# Altium footprint library 常用元件封装库.PcbLib: 1310 footprints (part 29 of 83)
Each footprint in its own frame and in the unit in brackets; x right, y up, seen from the top. Pads: shape width x height; smd on the part's side, far side on the other; paste and mask are expansions set on the pad; w line width, h text height; cw(c..) or ccw(c..) is an arc to the next point about the centre after c.
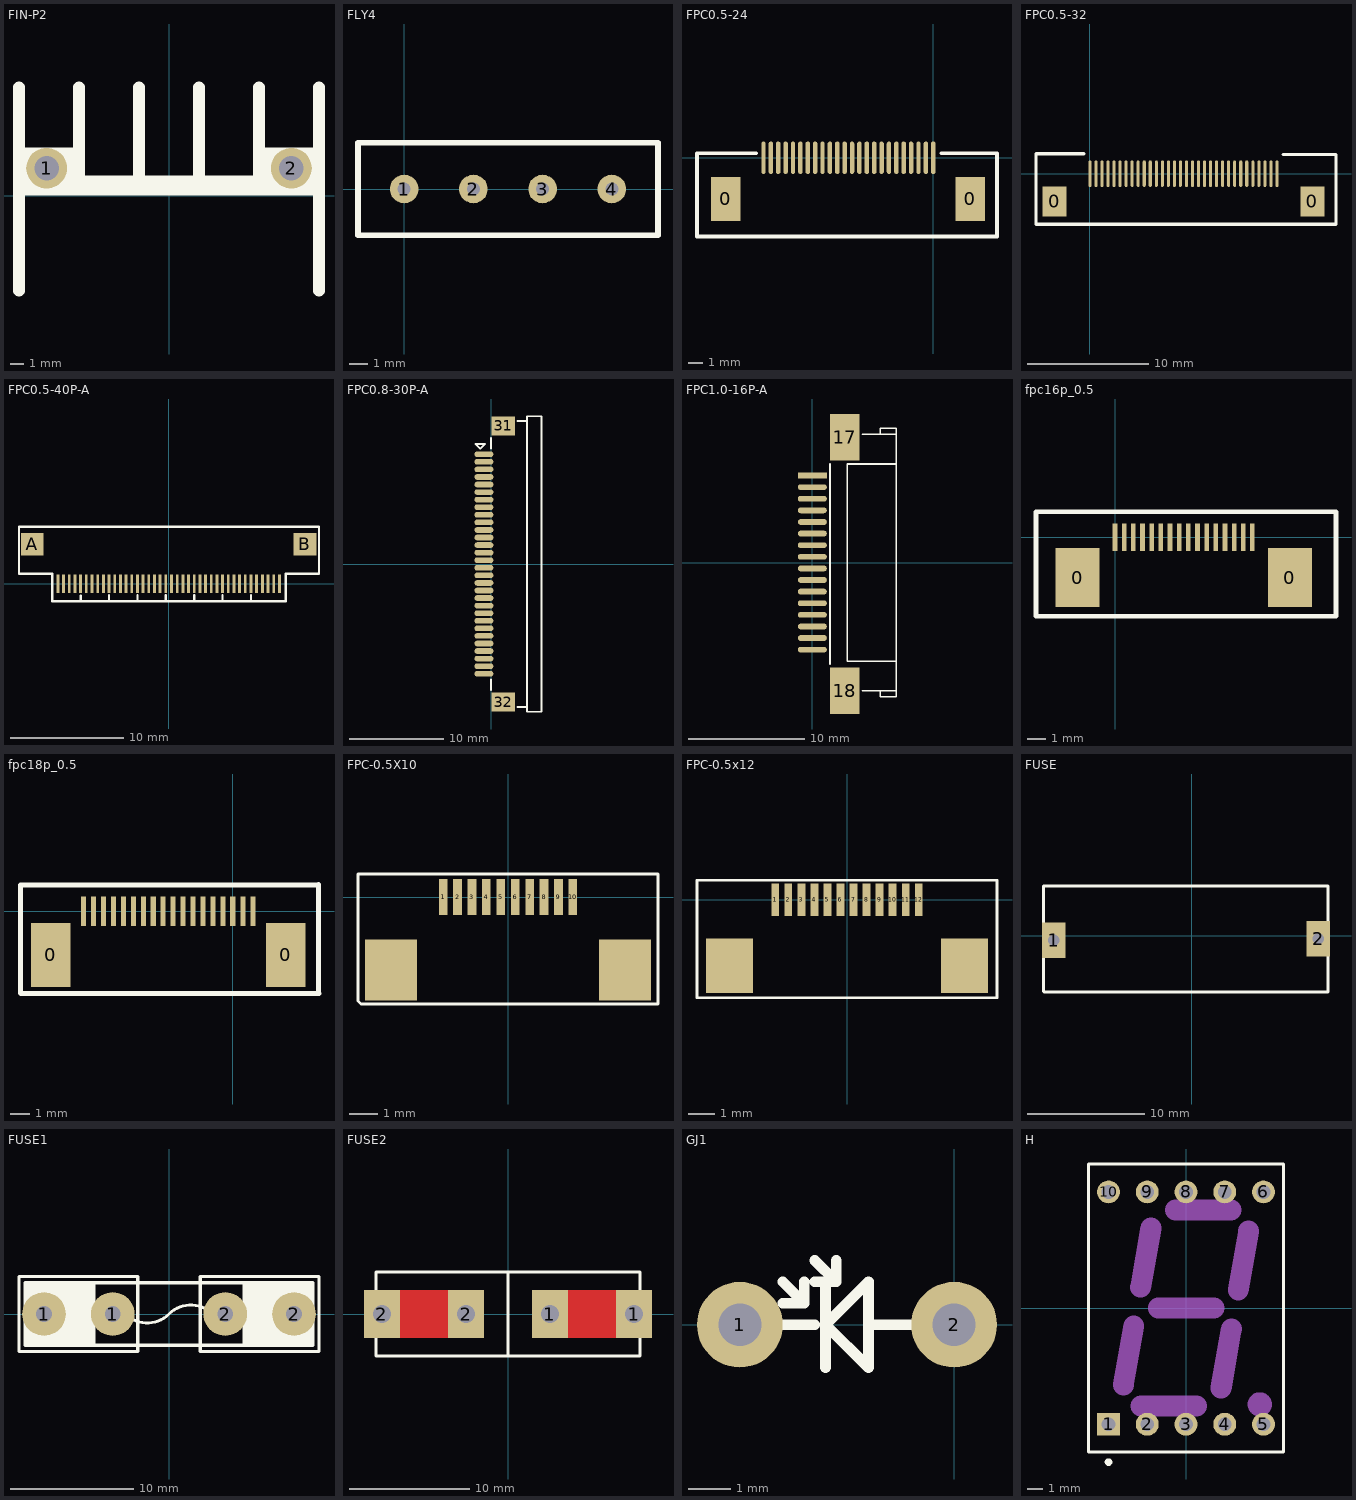
[diagram p28: the footprints below, top view; thin cyan lines are the x and y axes]

## FIN-P2 [mm] "散热片"
height 1.9
pads (2):
  round 3 hole 1.8: 1(-9.017,2.032) 2(9.017,2.032)
Top Overlay:
  rectangle: -11.049,0.889 -6.629,3.556
  rectangle: 6.629,1.27 11.049,3.556
  lines w0.85: -11.049,-7 -11.049,8 ; -6.629,0.762 -6.629,8.001 ; -2.21,0.762 -2.21,8.001 ; 2.21,0.762 2.21,8.001 ; 6.629,0.762 6.629,8.001 ; 11.049,-7 11.049,8
  lines w1.5: -10.668,0.762 10.668,0.762

## FLY4 [mil]
pads (4):
  round 62 hole 28: 1(0,0) 2(150,0) 3(300,0) 4(450,0)
Top Overlay:
  lines w12: -100,-100 550,-100 550,100 -100,100 -100,-100

## FPC0.5-24 [mm]
height 19.2
pads (26):
  rect 2x3 smd: 0(-14.04,-2.794) 0(2.51,-2.794)
  oval 0.3x2.2 smd: 1(0,0) 2(-0.5,0) 3(-1,0) 4(-1.5,0) 5(-2,0) 6(-2.5,0) 7(-3,0) 8(-3.5,0) 9(-4,0) 10(-4.5,0) 11(-5,0) 12(-5.5,0) 13(-6,0) 14(-6.5,0) 15(-7,0) 16(-7.5,0) 17(-8,0) 18(-8.5,0) 19(-9,0) 20(-9.5,0) 21(-10,0) 22(-10.5,0) 23(-11,0) 24(-11.5,0)
Top Overlay:
  lines w0.254: -12,0.305 -16.002,0.305 -16.002,-5.334 4.318,-5.334 4.318,0.305 0.563,0.305
3D body "2-1734839-4.stp": height 2.07, standoff 0.02, extent -14.5,-5.364 2.93,-0.254

## FPC0.5-32 [mm]
pads (34):
  rect 2x2.5 smd: 0(-2.935,-2.295) 0(18.435,-2.295)
  oval 0.254x2.2 smd: 1(0,0) 2(0.5,0) 3(1,0) 4(1.5,0) 5(2,0) 6(2.5,0) 7(3,0) 8(3.5,0) 9(4,0) 10(4.5,0) 11(5,0) 12(5.5,0) 13(6,0) 14(6.5,0) 15(7,0) 16(7.493,0) 17(8,0) 18(8.5,0) 19(9,0) 20(9.5,0) 21(10,0) 22(10.5,0) 23(11,0) 24(11.5,0) 25(12,0) 26(12.5,0) 27(13,0) 28(13.5,0) 29(14,0) 30(14.5,0) 31(15,0) 32(15.5,0)
Top Overlay:
  lines w0.254: -0.5,1.651 -4.47,1.651 -4.47,-4.195 20.396,-4.195 20.396,1.575 16,1.575
3D body "3-1734820-2.stp": height 2.04, standoff 0.14, extent -3.404,-6.173 18.846,0.027

## FPC0.5-40P-A [mm]
height 1
pads (42):
  rect 0.25x1.6 smd: 1(-9.78,0.011) 2(-9.28,0.011) 3(-8.78,0.011) 4(-8.28,0.011) 5(-7.78,0.011) 6(-7.28,0.011) 7(-6.78,0.011) 8(-6.28,0.011) 9(-5.78,0.011) 10(-5.28,0.011) 11(-4.78,0.011) 12(-4.28,0.011) 13(-3.78,0.011) 14(-3.28,0.011) 15(-2.78,0.011) 16(-2.28,0.011) 17(-1.78,0.011) 18(-1.28,0.011) 19(-0.78,0.011) 20(-0.28,0.011) 21(0.22,0.011) 22(0.72,0.011) 23(1.22,0.011) 24(1.72,0.011) 25(2.22,0.011) 26(2.72,0.011) 27(3.22,0.011) 28(3.72,0.011) 29(4.22,0.011) 30(4.72,0.011) 31(5.22,0.011) 32(5.72,0.011) 33(6.22,0.011) 34(6.72,0.011) 35(7.22,0.011) 36(7.72,0.011) 37(8.22,0.011) 38(8.72,0.011) 39(9.22,0.011) 40(9.72,0.011)
  rect 2x2 smd: A(-12.029,3.5) B(11.971,3.5)
Top Overlay:
  lines w0.2: -10.287,-1.524 -10.287,0.889 -13.208,0.889 -13.208,5.036 13.208,5.036 13.208,1.27 13.208,0.889 10.287,0.889 10.287,-1.514 -10.287,-1.514 ; -7.78,-1.514 -7.78,-1.014 ; -5.28,-1.514 -5.28,-0.989 ; -2.78,-1.489 -2.78,-0.989 ; -0.28,-1.464 -0.28,-0.964 ; 2.22,-1.464 2.22,-0.964 ; 4.72,-1.464 4.72,-0.964 ; 7.22,-1.464 7.22,-0.964

## FPC0.8-30P-A [mm] "FPC"
height 1.2
pads (32):
  oval 2x0.6 smd: 1(-0.762,11.6) 2(-0.762,10.8) 3(-0.762,10) 4(-0.762,9.2) 5(-0.762,8.4) 6(-0.762,7.6) 7(-0.762,6.8) 8(-0.762,6) 9(-0.762,5.2) 10(-0.762,4.4) 11(-0.762,3.6) 12(-0.762,2.8) 13(-0.762,2) 14(-0.762,1.2) 15(-0.762,0.4) 16(-0.762,-0.4) 17(-0.762,-1.2) 18(-0.762,-2) 19(-0.762,-2.8) 20(-0.762,-3.6) 21(-0.762,-4.4) 22(-0.762,-5.2) 23(-0.762,-6) 24(-0.762,-6.8) 25(-0.762,-7.6) 26(-0.762,-8.4) 27(-0.762,-9.2) 28(-0.762,-10) 29(-0.762,-10.8) 30(-0.762,-11.6)
  rect 2.5x2 smd: 31(1.27,14.605) 32(1.27,-14.605)
Top Overlay:
  lines w0.2: 0,-13.335 0,-12.192 ; 0,12.192 0,13.335 ; 2.794,-15.113 3.81,-15.113 ; 2.794,15.113 3.81,15.113 ; 3.81,-15.113 3.81,15.113 ; 3.81,-15.113 3.81,-15.621 5.334,-15.621 5.334,15.621 3.81,15.621 3.81,15.113 ; -1.651,12.7 -1.143,12.192 -0.635,12.7 -1.524,12.7 -1.651,12.7

## FPC1.0-16P-A [mm] "FPC"
height 1.2
pads (18):
  rect 2.5x0.5 smd: 1(0,7.493)
  oval 2.5x0.5 smd: 2(0,6.493) 3(0,5.493) 4(0,4.493) 5(0,3.493) 6(0,2.493) 7(0,1.493) 8(0,0.493) 9(0,-0.507) 10(0,-1.507) 11(0,-2.507) 12(0,-3.507) 13(0,-4.507) 14(0,-5.507) 15(0,-6.507) 16(0,-7.507)
  rect 2.5x4 smd: 17(2.794,10.795) 18(2.794,-11.049)
Top Overlay:
  lines w0.15: 1.524,-8.763 1.524,8.509 ; 4.318,-11.049 7.224,-11.049 ; 4.318,11.049 7.224,11.049 ; 5.842,11.049 5.842,11.557 7.224,11.557 7.224,11.049 ; 6.096,-11.049 5.842,-11.049 5.842,-11.557 7.224,-11.557 7.224,-11.049 ; 7.224,-8.507 3,-8.507 3,8.493 7.224,8.493 ; 7.224,-11.049 7.224,11.049

## fpc16p_0.5 [mm]
height 1.45
pads (18):
  rect 2.4x3.2 smd: 0(-2.05,-2.2) 0(9.55,-2.2)
  rect 0.254x1.5 smd: 1(0,0) 2(0.5,0) 3(1,0) 4(1.5,0) 5(2,0) 6(2.5,0) 7(3,0) 8(3.5,0) 9(4,0) 10(4.5,0) 11(5,0) 12(5.5,0) 13(6,0) 14(6.5,0) 15(7,0) 16(7.5,0)
Top Overlay:
  lines w0.254: -4.318,-4.318 12.065,-4.318 12.065,1.397 -4.318,1.397 -4.318,-4.318

## fpc18p_0.5 [mm]
height 1.45
pads (20):
  rect 2x3.2 smd: 0(-9.143,-2.2) 0(2.673,-2.2)
  rect 0.254x1.5 smd: 1(-7.493,0) 2(-6.993,0) 3(-6.493,0) 4(-5.993,0) 5(-5.493,0) 6(-4.993,0) 7(-4.493,0) 8(-3.993,0) 9(-3.493,0) 10(-2.993,0) 11(-2.493,0) 12(-1.993,0) 13(-1.493,0) 14(-0.993,0) 15(-0.493,0) 16(0.007,0) 17(0.523,0) 18(1.023,0)
Top Overlay:
  lines w0.254: -10.668,-4.115 -10.643,-4.14 4.343,-4.14 4.318,-4.115 4.318,1.346 4.293,1.321 -10.668,1.321 -10.668,-4.115
3D body "1-1734839-8.stp": height 2.07, standoff 0.02, extent -10.441,-5.014 3.989,0.096

## FPC-0.5X10 [mm]
pads (12):
  rect 0.3x1.25 smd: 1(-2.25,0) 2(-1.75,0) 3(-1.25,0) 4(-0.75,0) 5(-0.25,0) 6(0.25,0) 7(0.75,0) 8(1.25,0) 9(1.75,0) 10(2.25,0)
  rect 1.8x2.1 smd: ""(-4.05,-2.525) ""(4.05,-2.525)
Top Overlay:
  lines w0.102: -5.2,-3.6 -5.2,0.8 5.2,0.8 5.2,-3.7 -5.1,-3.7 -5.2,-3.6

## FPC-0.5x12 [mm]
pads (14):
  rect 0.3x1.25 smd: 1(-2.75,0) 2(-2.25,0) 3(-1.75,0) 4(-1.25,0) 5(-0.75,0) 6(-0.25,0) 7(0.25,0) 8(0.75,0) 9(1.25,0) 10(1.75,0) 11(2.25,0) 12(2.75,0)
  rect 1.8x2.1 smd: ""(-4.5,-2.525) ""(4.5,-2.525)
Top Overlay:
  lines w0.102: -5.75,-3.75 5.75,-3.75 5.75,0.75 -5.75,0.75 -5.75,-3.75

## FUSE [mm]
pads (2):
  rect 2x3 hole 1 square: 1(-11.76,-0.381) 2(10.744,-0.254)
Top Overlay:
  lines w0.254: -12.624,-4.724 -12.624,4.242 11.582,4.242 11.582,-4.775 -12.573,-4.775 -12.624,-4.724
3D body "User Library-5x20mm PCB Fuse Holder Assy_ 1.STEP": height 14.29, standoff -4.06, extent -12.62,-4.79 11.63,4.21

## FUSE1 [mil]
pads (4):
  round 140 hole 50: 1(-400,0) 1(-180,0) 2(180,0) 2(400,0)
Top Overlay:
  rectangle: -460,-100 -240,100
  rectangle: 240,-100 460,100
  lines w10: -240,-100 -240,100 ; -140,0 ccw(c-70,70) 0,0 cw(c70,-70) 140,0 ; 240,-100 240,100 ; -480,-120 -480,0 -480,120 -100,120 -100,-120 -480,-120 ; -460,-100 460,-100 460,100 440,100 -460,100 -460,-100 ; 100,-120 100,120 480,120 480,-120 100,-120

## FUSE2 [mil]
pads (4):
  rect 118x157 hole 59: 1(137.5,0) 1(413.5,0) 2(-413.5,0) 2(-137.5,0)
Top Layer:
  rectangle: -373.5,-79 -177.5,79
  rectangle: 177.5,-79 374.5,79
Bottom Layer:
  rectangle: 177.5,-79 374.5,79
  rectangle: -373.5,-79 -177.5,79
Top Overlay:
  lines w10: 0.5,-138 0.5,138 ; -432.5,-138 433.5,-138 433.5,138 -432.5,138 -432.5,-138

## GJ1 [mil]
pads (2):
  round 80 hole 40: 1(-200,0) 2(0,0)
Top Overlay:
  lines w10: -200,0 -130,0 ; -160,20 -140,20 ; -160,40 -140,20 ; -140,40 -140,20 ; -130,40 -110,40 ; -130,60 -110,40 ; -120,-40 -120,40 ; -110,60 -110,40 ; -75,0 -5,0 ; -120,0 -80,-40 -80,20 -80,40 -120,0

## H [mm] "LED, 7-Segment Display, 14.2 mm, RHD; 10 Leads; Row Space 15.24 mm; Pitch 2.54 mm"
height 8.25
pads (10):
  rect 1.5x1.5 hole 0.9: 1(-5.08,-7.62)
  round 1.5 hole 0.9: 2(-2.54,-7.62) 3(0,-7.62) 4(2.54,-7.62) 5(5.08,-7.62) 6(5.08,7.62) 7(2.54,7.62) 8(0,7.62) 9(-2.54,7.62) 10(-5.08,7.62)
Top Overlay:
  circle w0.25: c-5.08,-10.1 r0.125
  lines w0.2: -6.4,-9.45 -6.4,9.45 6.4,9.45 6.4,-9.45 -6.4,-9.45
Mechanical 1:
  circle w1: c4.842,-6.316 r0.296
  lines w1.37: -4.108,-5.054 -3.425,-1.17 ; -2.974,1.368 -2.293,5.255 ; -2.958,-6.429 0.692,-6.426 ; -1.821,0 1.828,0 ; -0.689,6.425 2.96,6.425 ; 2.295,-5.256 2.98,-1.371 ; 3.427,1.169 4.11,5.058